# Altium footprint library PcbLib.PcbLib: 116 footprints (part 8 of 8)
Each footprint in its own frame and in the unit in brackets; x right, y up, seen from the top. Pads: shape width x height; smd on the part's side, far side on the other; paste and mask are expansions set on the pad; w line width, h text height; cw(c..) or ccw(c..) is an arc to the next point about the centre after c.
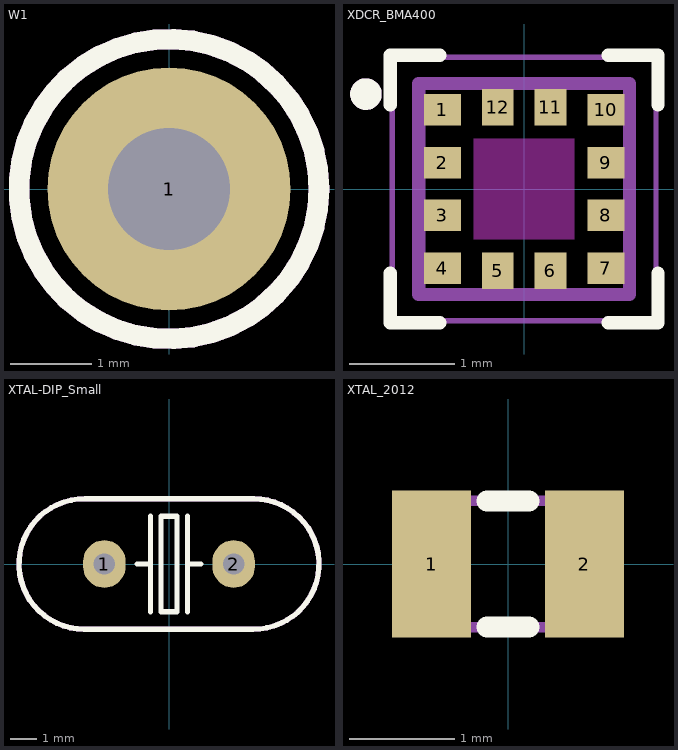
[diagram p7: the footprints below, top view; thin cyan lines are the x and y axes]

## W1 [mm]
pads (1):
  round 3 hole 1.5: 1(0,0)
Top Overlay:
  circle w0.254: c0,0 r1.849
Mechanical 29:
  circle w0.254: c0,0 r1.849
  text ".Designator" at -0.308,0.025 h1

## XDCR_BMA400 [mm]
pads (12):
  rect 0.35x0.3 smd paste-1 mask+0: 1(-0.775,0.75) 2(-0.775,0.25) 3(-0.775,-0.25) 4(-0.775,-0.75) 7(0.775,-0.75) 8(0.775,-0.25) 9(0.775,0.25) 10(0.775,0.75)
  rect 0.3x0.35 smd paste-1 mask+0: 5(-0.25,-0.775) 6(0.25,-0.775) 11(0.25,0.775) 12(-0.25,0.775)
Top Overlay:
  circle w0.15: c-1.5,0.9 r0.075
  lines w0.127: -1.27,-0.8 -1.27,-1.27 -0.8,-1.27 ; -1.27,0.8 -1.27,1.27 -0.8,1.27 ; 0.8,-1.27 1.27,-1.27 1.27,-0.8 ; 0.8,1.27 1.27,1.27 1.27,0.8
Top Paste:
  region: 0.375,0.625 0.125,0.625 0.125,0.925 0.375,0.925
  region: -0.125,0.625 -0.375,0.625 -0.375,0.925 -0.125,0.925
  region: 0.375,-0.925 0.125,-0.925 0.125,-0.625 0.375,-0.625
  region: -0.125,-0.925 -0.375,-0.925 -0.375,-0.625 -0.125,-0.625
  region: 0.925,-0.875 0.625,-0.875 0.625,-0.625 0.925,-0.625
  region: 0.925,-0.375 0.625,-0.375 0.625,-0.125 0.925,-0.125
  region: 0.925,0.125 0.625,0.125 0.625,0.375 0.925,0.375
  region: 0.925,0.625 0.625,0.625 0.625,0.875 0.925,0.875
  region: -0.625,0.625 -0.925,0.625 -0.925,0.875 -0.625,0.875
  region: -0.625,0.125 -0.925,0.125 -0.925,0.375 -0.625,0.375
  region: -0.625,-0.375 -0.925,-0.375 -0.925,-0.125 -0.625,-0.125
  region: -0.625,-0.875 -0.925,-0.875 -0.925,-0.625 -0.625,-0.625
Top Solder:
  region: 0.45,-1 0.05,-1 0.05,-0.55 0.45,-0.55
  region: -0.05,-1 -0.45,-1 -0.45,-0.55 -0.05,-0.55
  region: 0.45,0.55 0.05,0.55 0.05,1 0.45,1
  region: -0.05,0.55 -0.45,0.55 -0.45,1 -0.05,1
  region: 1,-0.95 0.55,-0.95 0.55,-0.55 1,-0.55
  region: 1,-0.45 0.55,-0.45 0.55,-0.05 1,-0.05
  region: 1,0.05 0.55,0.05 0.55,0.45 1,0.45
  region: 1,0.55 0.55,0.55 0.55,0.95 1,0.95
  region: -0.55,-0.95 -1,-0.95 -1,-0.55 -0.55,-0.55
  region: -0.55,-0.45 -1,-0.45 -1,-0.05 -0.55,-0.05
  region: -0.55,0.05 -1,0.05 -1,0.45 -0.55,0.45
  region: -0.55,0.55 -1,0.55 -1,0.95 -0.55,0.95
Keep-Out Layer:
  region: 0.475,-0.475 -0.475,-0.475 -0.475,0.475 0.475,0.475
  region: 0.475,-0.475 -0.475,-0.475 -0.475,0.475 0.475,0.475
Mechanical 29:
  circle w0.15: c-1.5,0.9 r0.075
  lines w0.127: -1,-1 -1,1 1,1 1,-1 -1,-1
  text ".Designator" at -0.689,-0.61 h1
Mechanical 15:
  lines w0.05: -1.25,-1.25 -1.25,1.25 1.25,1.25 1.25,-1.25 -1.25,-1.25
3D body "BMA400.STEP": height 1, standoff 0, extent -1,-1 1,1

## XTAL-DIP_Small [mm]
pads (2):
  oval 1.6x1.8 hole 0.8: 1(-2.44,0) 2(2.44,0)
Top Overlay:
  lines w0.2: -1.2,0 -0.7,0 ; -0.7,-1.8 -0.7,1.8 ; 0.7,-1.8 0.7,1.8 ; 0.7,0 1.2,0 ; 3.2,2.46 -3.159,2.46 ccw(c-3.2,0) -3.2,-2.46 3.159,-2.46 ccw(c3.2,0) 3.2,2.46 ; -0.3,-1.8 0.3,-1.8 0.3,1.8 0,1.8 -0.3,1.8 -0.3,-1.8
Mechanical 29:
  lines w0.2: 3.2,2.46 -3.159,2.46 ccw(c-3.2,0) -3.2,-2.46 3.159,-2.46 ccw(c3.2,0) 3.2,2.46
  text ".Designator" at -1.1,-0.367 h1
3D body "ABRACON_ABL-8.000MHZ-B2.STEP": height 3.55, standoff -2.02, extent -5.75,-2.5 5.75,2.5

## XTAL_2012 [mm]
pads (2):
  rect 0.75x1.4 smd: 1(-0.725,0) 2(0.725,0)
Top Overlay:
  lines w0.2: -0.2,-0.6 0.2,-0.6 ; -0.2,0.6 0.2,0.6
Mechanical 29:
  lines w0.1: -1,-0.5 cw(c-1,-0.6) -0.9,-0.6 0.9,-0.6 cw(c1,-0.6) 1,-0.5 1,0.5 cw(c1,0.6) 0.9,0.6 -0.9,0.6 cw(c-1,0.6) -1,0.5 -1,-0.5
  text ".Designator" at -0.3,-0.1 h0.3
3D body "User Library-ABS06.STEP": height 0.6, standoff 0, extent -1,-0.61 1,0.61